# Altium footprint library NXP_60_26022015.PCBLIB: 287 footprints (part 2 of 18)
Each footprint in its own frame and in the unit in brackets; x right, y up, seen from the top. Pads: shape width x height; smd on the part's side, far side on the other; paste and mask are expansions set on the pad; w line width, h text height; cw(c..) or ccw(c..) is an arc to the next point about the centre after c.
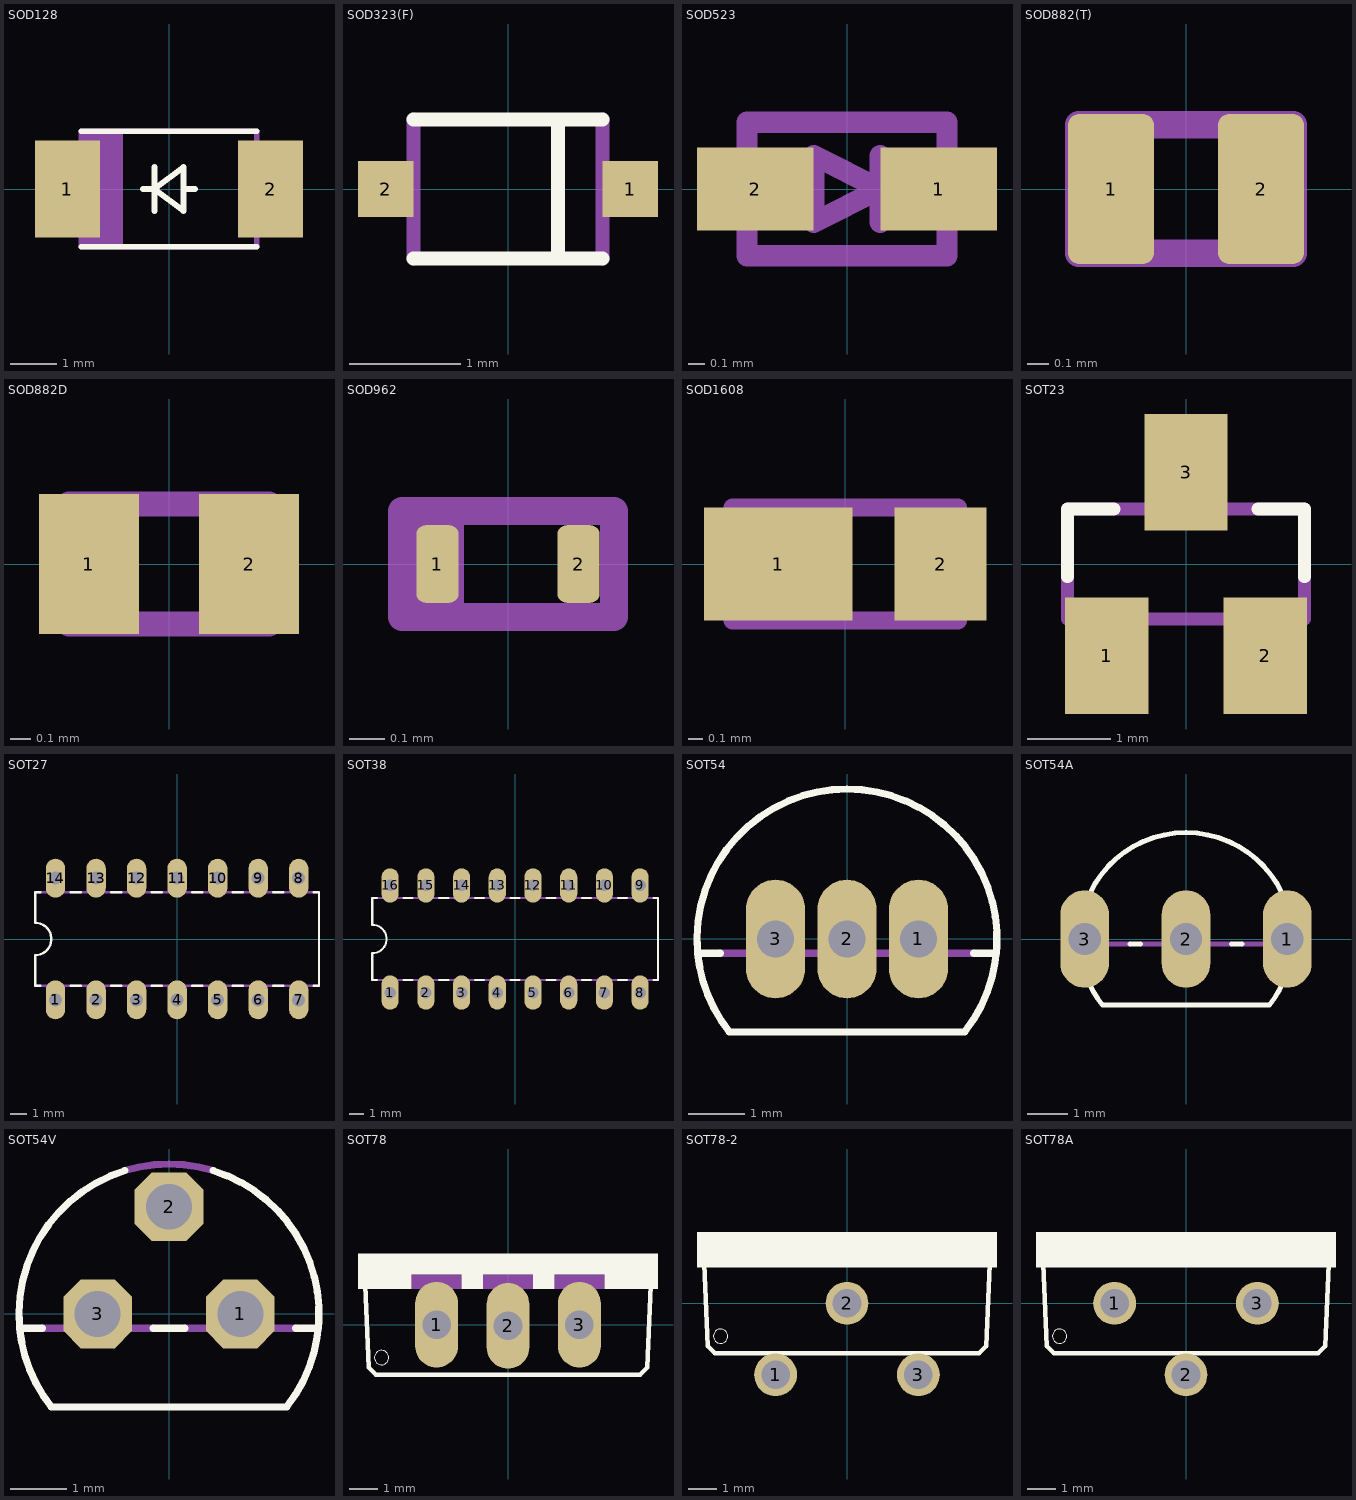
[diagram p1: the footprints below, top view; thin cyan lines are the x and y axes]

## SOD128 [mm]
pads (2):
  rect 1.4x2.1 smd: 1(-2.2,0) 2(2.2,0)
Top Overlay:
  lines w0.127: -1.9,-1.25 1.9,-1.25 ; -1.9,1.25 1.9,1.25 ; -0.561,0 -0.318,0 ; -0.318,-0.476 -0.318,0 ; -0.318,0.476 -0.318,0 ; 0.561,0 0.318,0 ; -0.318,0 0.318,-0.476 0.318,0 ; -0.318,0 0.318,0.476 0.318,0
Top Paste:
  rectangle: 1.6,-0.95 2.8,0.95
  rectangle: -2.8,-0.95 -1.6,0.95
Mechanical 16:
  rectangle: -1.9,-1.25 -1,1.25
  rectangle: 1.9,-0.9 2.3,0.9
  region: -1.9,0.9 -2.3,0.9 -2.3,-0.9 -1.9,-0.9
  lines w0.127: -1.9,-1.25 1.9,-1.25 1.9,1.25 -1.9,1.25 -1.9,-1.25

## SOD323(F) [mm]
pads (2):
  rect 0.5x0.5 smd: 1(1.1,0) 2(-1.1,0)
Top Overlay:
  lines w0.127: -0.85,-0.625 0.45,-0.625 ; -0.85,0.625 0.45,0.625 ; 0.85,-0.625 0.45,-0.625 ; 0.85,0.625 0.45,0.625 ; 0.45,-0.625 0.45,0.625
Mechanical 16:
  rectangle: -1.25,-0.15 -0.85,0.15
  region: 1.25,0.15 0.85,0.15 0.85,-0.15 1.25,-0.15
  lines w0.127: -0.85,-0.625 -0.85,0.625 ; 0.85,-0.625 0.85,0.625

## SOD523 [mm]
pads (2):
  rect 0.7x0.5 smd: 1(0.55,0) 2(-0.55,0)
Mechanical 16:
  rectangle: -0.8,-0.15 -0.6,0.15
  rectangle: 0.6,-0.15 0.8,0.15
  lines w0.127: 0.2,-0.2 0.2,0 ; 0.2,0.2 0.2,0 ; 0.2,0 -0.2,-0.2 -0.2,0.2 0.2,0 ; -0.6,-0.4 -0.6,0.4 0.6,0.4 0.6,-0.4 -0.6,-0.4

## SOD882(T) [mm]
pads (2):
  rrect25% 0.4x0.7 smd: 1(-0.35,0) 2(0.35,0)
Top Paste:
  rectangle: -0.5,-0.3 -0.2,0.3
  rectangle: 0.2,-0.3 0.5,0.3
Top Solder:
  rectangle: -0.6,-0.4 -0.1,0.4
  rectangle: 0.1,-0.4 0.6,0.4
Mechanical 16:
  rectangle: -0.45,-0.35 -0.15,0.35
  lines w0.127: -0.5,-0.3 0.5,-0.3 0.5,0.3 -0.5,0.3 -0.5,-0.3

## SOD882D [mm]
pads (2):
  rect 0.5x0.7 smd: 1(-0.4,0) 2(0.4,0)
Top Paste:
  rectangle: 0.2,-0.3 0.5,0.3
  region: -0.2,0.3 -0.5,0.3 -0.5,-0.3 -0.2,-0.3
Top Solder:
  rectangle: 0.1,-0.4 0.7,0.4
  region: -0.1,0.4 -0.7,0.4 -0.7,-0.4 -0.1,-0.4
Mechanical 16:
  rectangle: -0.5,-0.3 -0.2,0.3
  lines w0.127: -0.5,-0.3 0.5,-0.3 0.5,0.3 -0.5,0.3 -0.5,-0.3

## SOD962 [mm]
pads (2):
  rrect43% 0.12x0.22 smd: 1(-0.2,0) 2(0.2,0)
Top Paste:
  circle w0: c0.2,0 r0.1
  circle w0: c-0.2,0 r0.1
Top Solder:
  rectangle: -0.425,-0.2 0.425,0.2
Mechanical 16:
  rectangle: -0.3,-0.125 -0.125,0.125
  lines w0.08: -0.3,-0.15 0.3,-0.15 0.3,0.15 -0.3,0.15 -0.3,-0.15

## SOD1608 [mil]
pads (2):
  rect 41.34x31.5 smd: 1(-18.7,0)
  rect 25.59x31.5 smd: 2(26.57,0)
Top Paste:
  rectangle: -37.4,-13.78 0,13.78
  rectangle: 15.75,-13.78 37.4,13.78
Top Solder:
  rectangle: -41.34,-17.72 3.94,17.72
  rectangle: 11.81,-17.72 41.34,17.72
Mechanical 16:
  rectangle: -31.5,-15.75 -15.75,15.75
  lines w5: -31.5,-15.75 31.5,-15.75 31.5,15.75 -31.5,15.75 -31.5,-15.75

## SOT23 [mm]
pads (3):
  rect 1x1.4 smd: 1(-0.95,-1.1) 2(0.95,-1.1) 3(0,1.1)
Top Overlay:
  lines w0.152: -1.422,-0.152 -1.422,0.66 -0.864,0.66 ; 0.864,0.66 1.422,0.66 1.422,-0.152
Mechanical 16:
  rectangle: -0.229,0.711 0.229,1.295
  rectangle: 0.711,-1.295 1.168,-0.711
  rectangle: -1.168,-1.295 -0.711,-0.711
  lines w0.152: -1.422,-0.66 1.422,-0.66 1.422,0.66 -1.422,0.66 -1.422,-0.66

## SOT27 [mil]
pads (14):
  oval 48x96 hole 32: 1(-300,-150) 2(-200,-150) 3(-100,-150) 4(0,-150) 5(100,-150) 6(200,-150) 7(300,-150) 8(300,150) 9(200,150) 10(100,150) 11(0,150) 12(-100,150) 13(-200,150) 14(-300,150)
Top Overlay:
  lines w6: -337.5,-115 -350,-115 -350,-40 ccw(c-350,0) -350,40 -350,115 -337.5,115 ; -262.5,-115 -237.5,-115 ; -262.5,115 -237.5,115 ; -162.5,-115 -137.5,-115 ; -162.5,115 -137.5,115 ; -62.5,-115 -37.5,-115 ; -62.5,115 -37.5,115 ; 37.5,-115 62.5,-115 ; 37.5,115 62.5,115 ; 137.5,-115 162.5,-115 ; 137.5,115 162.5,115 ; 237.5,-115 262.5,-115 ; 237.5,115 262.5,115 ; 337.5,-115 350,-115 350,115 337.5,115
Mechanical 16:
  lines w6: -350,-115 350,-115 ; -350,115 350,115

## SOT38 [mil]
pads (16):
  oval 48x96 hole 32: 1(-350,-150) 2(-250,-150) 3(-150,-150) 4(-50,-150) 5(50,-150) 6(150,-150) 7(250,-150) 8(350,-150) 9(350,150) 10(250,150) 11(150,150) 12(50,150) 13(-50,150) 14(-150,150) 15(-250,150) 16(-350,150)
Top Overlay:
  lines w6: -387.5,-115 -400,-115 -400,-40 ccw(c-400,0) -400,40 -400,115 -387.5,115 ; -312.5,-115 -287.5,-115 ; -312.5,115 -287.5,115 ; -212.5,-115 -187.5,-115 ; -212.5,115 -187.5,115 ; -112.5,-115 -87.5,-115 ; -112.5,115 -87.5,115 ; -12.5,-115 12.5,-115 ; -12.5,115 12.5,115 ; 87.5,-115 112.5,-115 ; 87.5,115 112.5,115 ; 187.5,-115 212.5,-115 ; 187.5,115 212.5,115 ; 287.5,-115 312.5,-115 ; 287.5,115 312.5,115 ; 387.5,-115 400,-115 400,115 387.5,115
Mechanical 16:
  lines w6: -400,-115 400,-115 ; -400,115 400,115

## SOT54 [mil]
pads (3):
  oval 41.5x83 hole 26: 1(50,0) 2(0,0) 3(-50,0)
Top Overlay:
  lines w5: -88.73,-10 -104.52,-10 ; 88.73,-10 104.52,-10 ; -104.52,-10 ccw(c0,0) -82.46,-65 82.46,-65 ccw(c0,0) 30.96,100.33 ccw(c0,-0.02) -30.96,100.33 ccw(c0,0) -104.52,-10
Mechanical 16:
  lines w5: -88.73,-10 -11.27,-10 11.27,-10 88.73,-10
  text "2" at -15,50 h42.5
  text "3" at -75,25 h42.5
  text "1" at 40,25 h33.46

## SOT54A [mil]
pads (3):
  oval 48x96 hole 32: 1(100,0) 2(0,0) 3(-100,0)
Top Overlay:
  lines w5: -95.02,-44.72 ccw(c-0.02,0.01) -82.48,-65 82.48,-65 ccw(c0.01,0) 95.46,-43.77 ; -95,44.72 cw(c0,0) 95,44.72 ; -55.28,-5 -44.72,-5 ; 44.72,-5 55.28,-5
Mechanical 16:
  lines w5: -95,-44.72 cw(c0,0) -104.88,-5 ; -95,44.72 ccw(c0,0) -104.88,-5 ; -55.28,-5 -104.88,-5 ; -44.72,-5 44.72,-5 ; 55.28,-5 104.88,-5 ; 95,-44.72 ccw(c0,0) 104.88,-5 ; 95,44.72 cw(c0,0) 104.88,-5

## SOT54V [mil]
pads (3):
  oct 48x48 hole 32: 1(50,0) 2(0,75) 3(-50,0)
Top Overlay:
  lines w5: -88.73,-10 -104.52,-10 ; -30.96,100.33 ccw(c0,0) -104.52,-10 ; -11.27,-10 11.27,-10 ; 30.96,100.33 cw(c0,0) 82.46,-65 -82.46,-65 cw(c0,0) -104.52,-10 ; 88.73,-10 104.52,-10
Mechanical 16:
  lines w5: -88.73,-10 -11.27,-10 ; -30.96,100.33 cw(c0,-0.02) 30.96,100.33 ; 11.27,-10 88.73,-10
  text "2" at -25,25 h42.5
  text "3" at -85,0 h42.5
  text "1" at 45,0 h33.46

## SOT78 [mil]
pads (3):
  oval 60x120 hole 40: 1(-100,0) 2(0,-1.57) 3(100,0)
Top Overlay:
  circle w0: c-177,-46 r10
  rectangle: -210,70 210,100
  rectangle: -210,50 -135,70
  rectangle: -65,50 -35,70
  rectangle: 35,50 65,70
  rectangle: 135,50 210,70
  lines w6: -200,55 -195,-60 -185,-70 185,-70 195,-60 200,55
Mechanical 16:
  rectangle: -135,50 -65,70
  rectangle: -35,50 35,70
  rectangle: 65,50 135,70

## SOT78-2 [mil]
pads (3):
  round 60 hole 40: 1(-100,-100) 2(0,0) 3(100,-100)
Top Overlay:
  circle w0: c-177,-46 r10
  rectangle: -210,50 210,100
  lines w6: -200,55 -195,-60 -185,-70 185,-70 195,-60 200,55
Mechanical 11:
  region: 0,0 10,0 10,10 0,10

## SOT78A [mil]
pads (3):
  round 60 hole 40: 1(-100,0) 2(0,-100) 3(100,0)
Top Overlay:
  circle w0: c-177,-46 r10
  rectangle: -210,50 210,100
  lines w6: -200,55 -195,-60 -185,-70 185,-70 195,-60 200,55